# Altium integrated library Integrated_Library - 02.02.25 - 22.49.IntLib: 792 symbols (part 2 of 11)
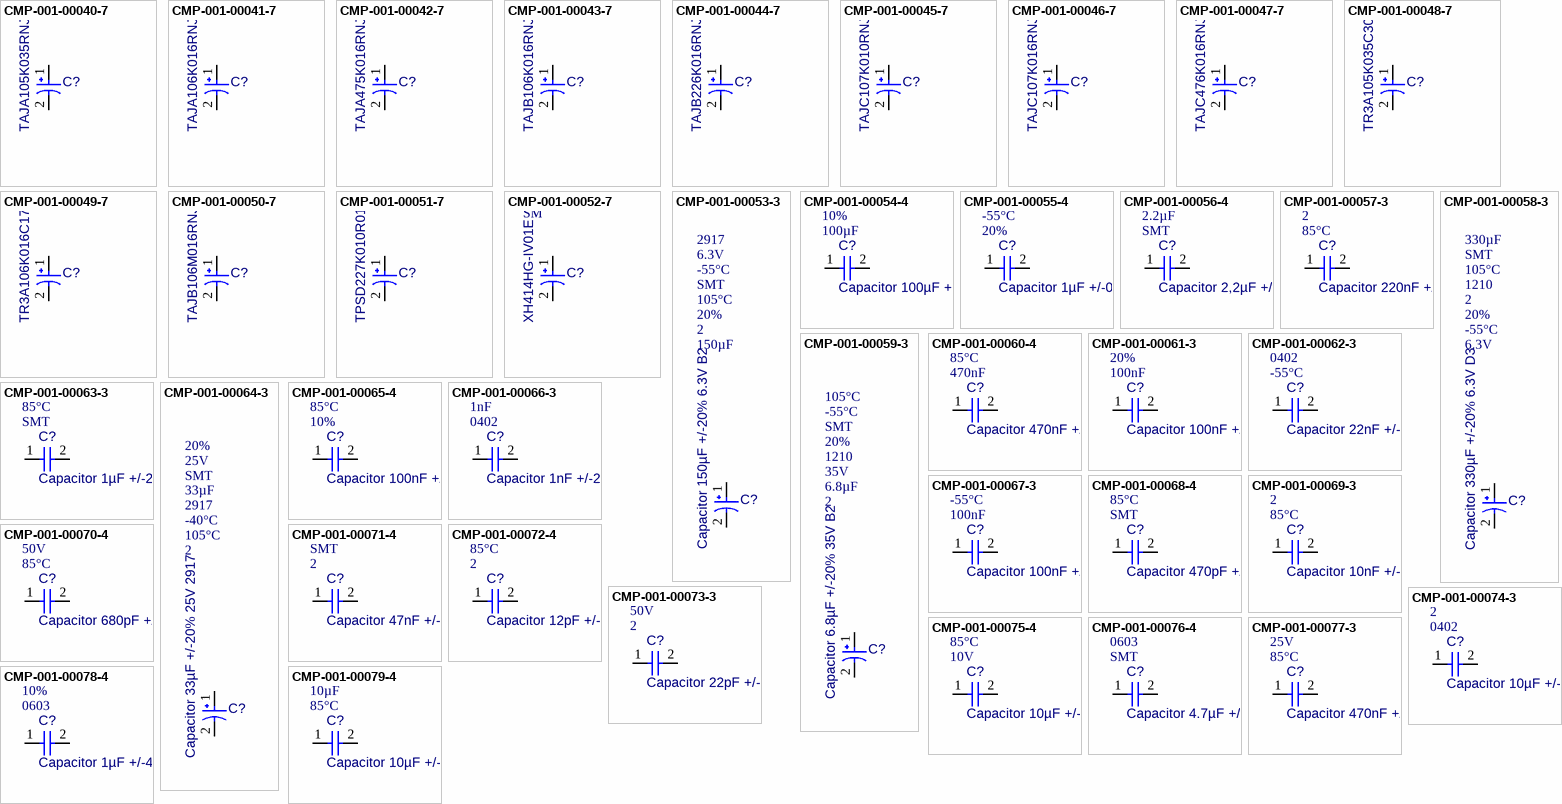
[diagram p27: symbols CMP-001-00040-7 to CMP-001-00079-4]

## CMP-001-00070-4
designator C?, comment Capacitor 680pF +/-20% 50V 0402  value 680pF  Max Operating Temperature: 85°C  Voltage Rating: 50V  Tolerance: 10%  Mounting Technology: SMT  Pins: 2  Case/Package: 0402  Min Operating Temperature: -55°C
Chip Capacitor, 680pF +/-20%, 50V, 0402, Thickness 0.33 mm
footprint CAPC0603(1608)100_L (Chip Capacitor, Body 1.6x0.8mm, Height 1.0mm, IPC High Density)
footprint CAPC0402(1005)33_L (Chip Capacitor, Body 1.0x0.5mm, Height 0.33mm, IPC High Density)
pins: 1, 2

## CMP-001-00071-4
designator C?, comment Capacitor 47nF +/-20% 50V 0402  value 47nF  Pins: 2  Mounting Technology: SMT  Voltage Rating: 50V  Case/Package: 0402  Max Operating Temperature: 85°C  Tolerance: 20%  Min Operating Temperature: -55°C
Chip Capacitor, 47nF +/-20%, 50V, 0402, Thickness 0.6 mm
footprint CAPC0603(1608)100_L (Chip Capacitor, Body 1.6x0.8mm, Height 1.0mm, IPC High Density)
footprint CAPC0402(1005)60_L (Chip Capacitor, Body 1.0x0.5mm, Height 0.6mm, IPC High Density)
pins: 1, 2

## CMP-001-00072-4
designator C?, comment Capacitor 12pF +/-10% 50V 0402  value 12pF  Pins: 2  Max Operating Temperature: 85°C  Case/Package: 0402  Voltage Rating: 50V  Tolerance: 20%  Mounting Technology: SMT  Min Operating Temperature: -55°C
Chip Capacitor, 12pF +/-10%, 50V, 0402, Thickness 0.33 mm
footprint CAPC0603(1608)100_L (Chip Capacitor, Body 1.6x0.8mm, Height 1.0mm, IPC High Density)
footprint CAPC0402(1005)33_L (Chip Capacitor, Body 1.0x0.5mm, Height 0.33mm, IPC High Density)
pins: 1, 2

## CMP-001-00073-3
designator C?, comment Capacitor 22pF +/-10% 50V 0402  value 22pF  Pins: 2  Voltage Rating: 50V  Max Operating Temperature: 85°C  Tolerance: 10%  Min Operating Temperature: -55°C  Mounting Technology: SMT  Case/Package: 0402
Chip Capacitor, 22pF +/-10%, 50V, 0402, Thickness 0.6 mm
footprint CAPC0603(1608)100_L (Chip Capacitor, Body 1.6x0.8mm, Height 1.0mm, IPC High Density)
footprint CAPC0402(1005)60_L (Chip Capacitor, Body 1.0x0.5mm, Height 0.6mm, IPC High Density)
pins: 1, 2

## CMP-001-00074-3
designator C?, comment Capacitor 10µF +/-40% 6.3V 0402  value 10µF  Case/Package: 0402  Pins: 2  Mounting Technology: SMT  Voltage Rating: 6.3V  Max Operating Temperature: 85°C  Min Operating Temperature: -55°C  Tolerance: 10%
Chip Capacitor, 10µF +/-40%, 6.3V, 0402, Thickness 0.6 mm
footprint CAPC0603(1608)100_L (Chip Capacitor, Body 1.6x0.8mm, Height 1.0mm, IPC High Density)
footprint CAPC0402(1005)60_L (Chip Capacitor, Body 1.0x0.5mm, Height 0.6mm, IPC High Density)
pins: 1, 2

## CMP-001-00075-4
designator C?, comment Capacitor 10µF +/-20% 10V 0603  value 10µF  Voltage Rating: 10V  Max Operating Temperature: 85°C  Pins: 2  Case/Package: 0603  Mounting Technology: SMT  Min Operating Temperature: -55°C  Tolerance: 10%
Chip Capacitor, 10µF +/-20%, 10V, 0603, Thickness 1 mm
footprint CAPC0603(1608)100_L (Chip Capacitor, Body 1.6x0.8mm, Height 1.0mm, IPC High Density)
footprint CAPC0603(1608)100_L (Chip Capacitor, Body 1.6x0.8mm, Height 1.0mm, IPC High Density)
pins: 1, 2

## CMP-001-00076-4
designator C?, comment Capacitor 4.7µF +/-20% 10V 0603  value 4.7µF  Mounting Technology: SMT  Case/Package: 0603  Pins: 2  Min Operating Temperature: -55°C  Tolerance: 10%  Max Operating Temperature: 85°C  Voltage Rating: 10V
Chip Capacitor, 4.7µF +/-20%, 10V, 0603, Thickness 1 mm
footprint CAPC0603(1608)100_L (Chip Capacitor, Body 1.6x0.8mm, Height 1.0mm, IPC High Density)
footprint CAPC0603(1608)100_L (Chip Capacitor, Body 1.6x0.8mm, Height 1.0mm, IPC High Density)
pins: 1, 2

## CMP-001-00077-3
designator C?, comment Capacitor 470nF +/-20% 25V 0603  value 470nF  Max Operating Temperature: 85°C  Voltage Rating: 25V  Pins: 2  Tolerance: 10%  Case/Package: 0603  Mounting Technology: SMT  Min Operating Temperature: -55°C
Chip Capacitor, 470nF +/-20%, 25V, 0603, Thickness 1 mm
footprint CAPC0603(1608)100_L (Chip Capacitor, Body 1.6x0.8mm, Height 1.0mm, IPC High Density)
footprint CAPC0603(1608)100_L (Chip Capacitor, Body 1.6x0.8mm, Height 1.0mm, IPC High Density)
pins: 1, 2

## CMP-001-00078-4
designator C?, comment Capacitor 1µF +/-40% 50V 0603  value 1µF  Case/Package: 0603  Tolerance: 10%  Pins: 2  Max Operating Temperature: 85°C  Voltage Rating: 50V  Mounting Technology: SMT  Min Operating Temperature: -55°C
Chip Capacitor, 1µF +/-40%, 50V, 0603, Thickness 1 mm
footprint CAPC0603(1608)100_L (Chip Capacitor, Body 1.6x0.8mm, Height 1.0mm, IPC High Density)
footprint CAPC0603(1608)100_L (Chip Capacitor, Body 1.6x0.8mm, Height 1.0mm, IPC High Density)
pins: 1, 2

## CMP-001-00079-4
designator C?, comment Capacitor 10µF +/-20% 25V 0805  value 10µF  Max Operating Temperature: 85°C  Case/Package: 0805  Voltage Rating: 25V  Tolerance: 10%  Min Operating Temperature: -55°C  Mounting Technology: SMT  Pins: 2
Chip Capacitor, 10µF +/-20%, 25V, 0805, Thickness 1.45 mm
footprint CAPC0603(1608)100_L (Chip Capacitor, Body 1.6x0.8mm, Height 1.0mm, IPC High Density)
footprint CAPC0805(2012)145_L (Chip Capacitor, Body 2.0x1.2mm, Height 1.45mm, IPC High Density)
pins: 1, 2

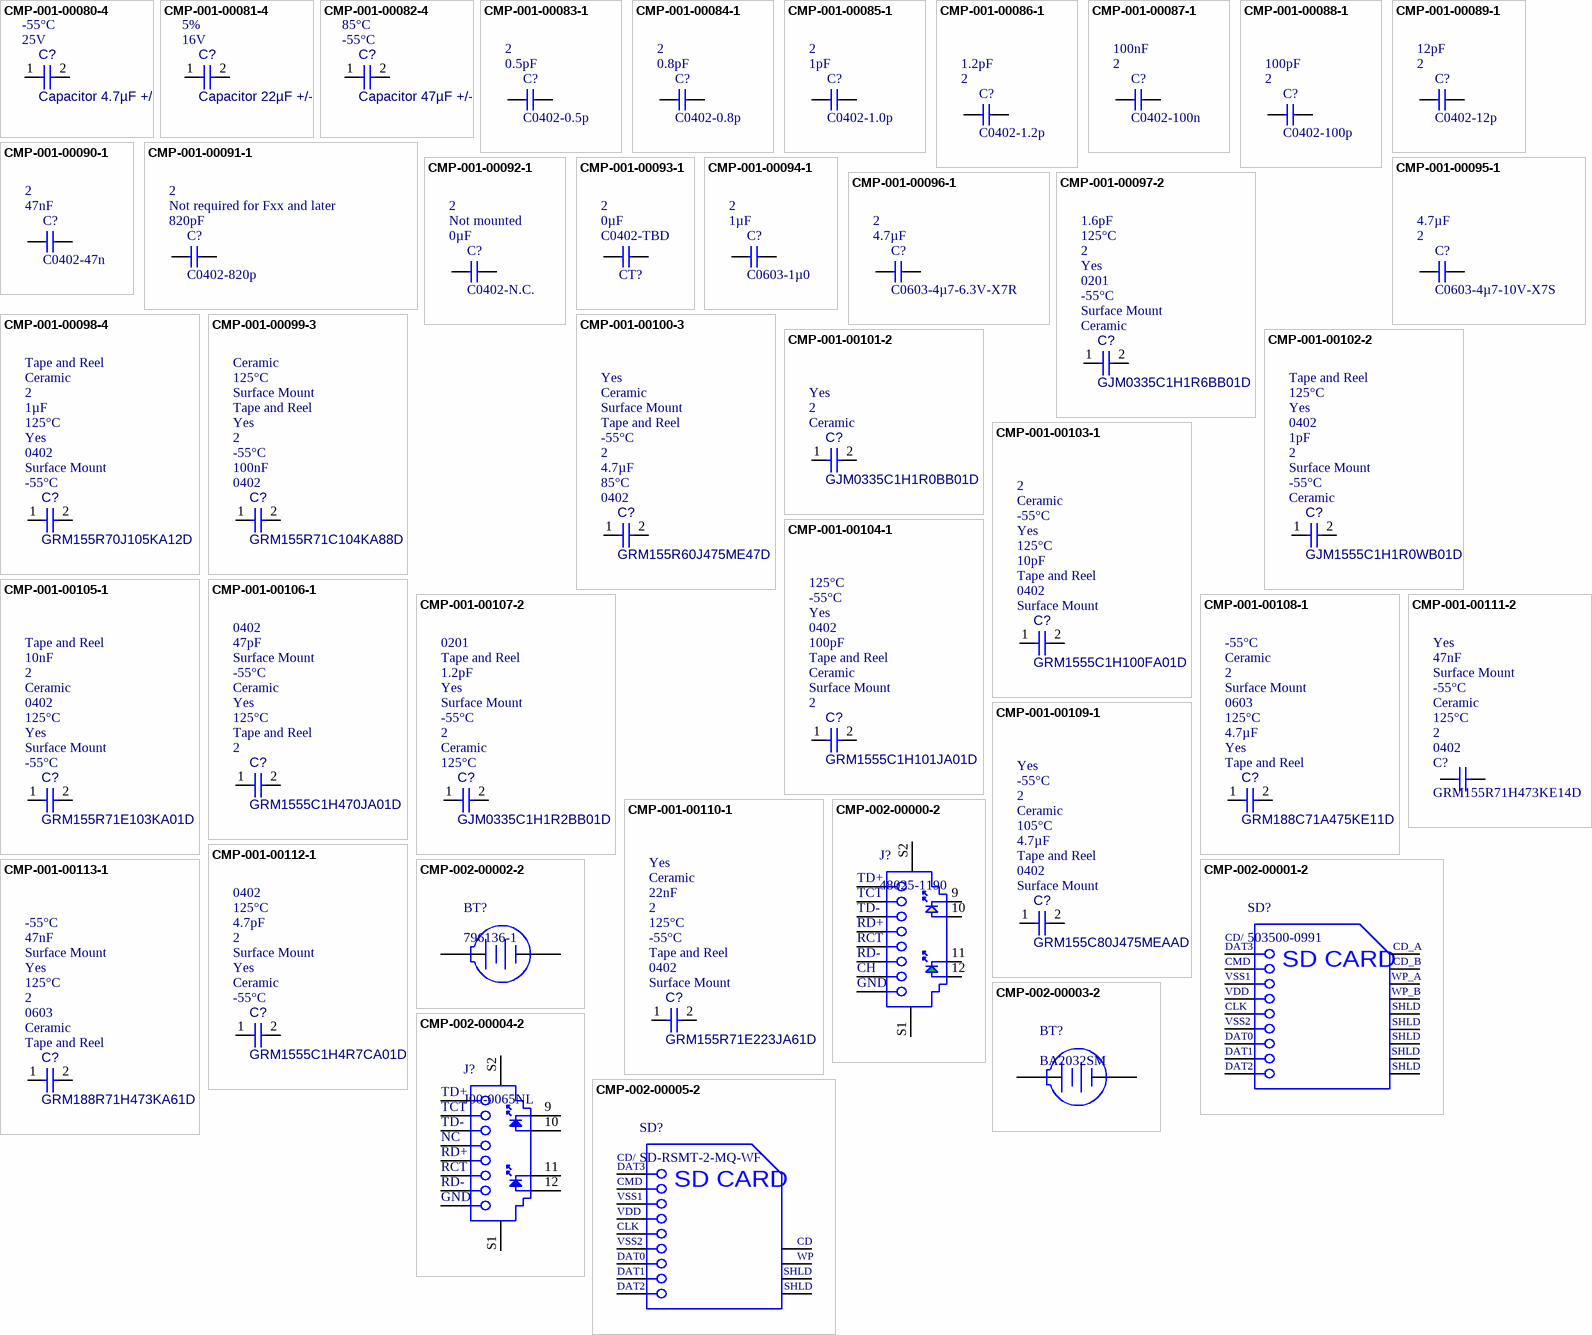
[diagram p2: symbols CMP-001-00080-4 to CMP-002-00005-2]

## CMP-001-00080-4
designator C?, comment Capacitor 4.7µF +/-40% 25V 0805  value 4.7µF  Voltage Rating: 25V  Min Operating Temperature: -55°C  Max Operating Temperature: 85°C  Pins: 2  Mounting Technology: SMT  Tolerance: 20%  Case/Package: 0805
Chip Capacitor, 4.7µF +/-40%, 25V, 0805, Thickness 1.45 mm
footprint CAPC0603(1608)100_L (Chip Capacitor, Body 1.6x0.8mm, Height 1.0mm, IPC High Density)
footprint CAPC0805(2012)145_L (Chip Capacitor, Body 2.0x1.2mm, Height 1.45mm, IPC High Density)
pins: 1, 2

## CMP-001-00081-4
designator C?, comment Capacitor 22µF +/-40% 16V 0805  value 22µF  Voltage Rating: 16V  Tolerance: 5%  Mounting Technology: SMT  Pins: 2  Max Operating Temperature: 85°C  Case/Package: 0805  Min Operating Temperature: -55°C
Chip Capacitor, 22µF +/-40%, 16V, 0805, Thickness 1.45 mm
footprint CAPC0603(1608)100_L (Chip Capacitor, Body 1.6x0.8mm, Height 1.0mm, IPC High Density)
footprint CAPC0805(2012)145_L (Chip Capacitor, Body 2.0x1.2mm, Height 1.45mm, IPC High Density)
pins: 1, 2

## CMP-001-00082-4
designator C?, comment Capacitor 47µF +/-40% 6.3V 0805  value 47µF  Min Operating Temperature: -55°C  Max Operating Temperature: 85°C  Case/Package: 0805  Pins: 2  Tolerance: 10%  Mounting Technology: SMT  Voltage Rating: 6.3V
Chip Capacitor, 47µF +/-40%, 6.3V, 0805, Thickness 1.45 mm
footprint CAPC0603(1608)100_L (Chip Capacitor, Body 1.6x0.8mm, Height 1.0mm, IPC High Density)
footprint CAPC0805(2012)145_L (Chip Capacitor, Body 2.0x1.2mm, Height 1.45mm, IPC High Density)
pins: 1, 2

## CMP-001-00083-1
designator C?, comment C0402-0.5p  value 0.5pF  Pins: 2
Capacitor, NP0, ±10%; Part Number: C0402-0.5p; LatestRevisionDate: 2017-02-23; Pad Count: 2; Footprint Doc: 0402; Design Item ID: C0402-0.5p; Source: nrf52840_qiaa.SCHLIB; Published: 2009-05-08; Component Type: Standard
footprint CAPC1608X06L
footprint CAPC1005X04L
pins: 1, 2

## CMP-001-00084-1
designator C?, comment C0402-0.8p  value 0.8pF  Pins: 2
Capacitor, NP0, ±10%; Design Item ID: C0402-0.8p; LatestRevisionDate: 2012-11-21; Footprint Doc: 0402; Component Type: Standard; Source: nrf52840_qiaa.SCHLIB; Part Number: C0402-0.8p; Pad Count: 2; Published: 2009-05-08
footprint CAPC1608X06L
footprint CAPC1005X04L
pins: 1, 2

## CMP-001-00085-1
designator C?, comment C0402-1.0p  value 1pF  Pins: 2
Capacitor, NP0, ±5%; Source: nrf52840_qiaa.SCHLIB; Component Type: Standard; Design Item ID: C0402-1.0p; Published: 2009-05-08; LatestRevisionDate: 2017-02-23; Pad Count: 2; Footprint Doc: 0402; Part Number: C0402-1.0p
footprint CAPC1608X06L
footprint CAPC1005X04L
pins: 1, 2

## CMP-001-00086-1
designator C?, comment C0402-1.2p  value 1.2pF  Pins: 2
Capacitor, NP0, ±5%; Design Item ID: C0402-1.2p; Footprint Doc: 0402; Source: nrf52840_qiaa.SCHLIB; Component Type: Standard; LatestRevisionDate: 2011-05-11; Published: 2009-05-08; Pad Count: 2; Part Number: C0402-1.2p
footprint CAPC1608X06L
footprint CAPC1005X04L
pins: 1, 2

## CMP-001-00087-1
designator C?, comment C0402-100n  value 100nF  Pins: 2
Capacitor, X7R, ±10%; Source: nrf52840_qiaa.SCHLIB; Published: 2009-05-08; Component Type: Standard; Pad Count: 2; Footprint Doc: 0402; Design Item ID: C0402-100n; Part Number: C0402-100n; LatestRevisionDate: 2009-11-23
footprint CAPC1608X06L
footprint CAPC1005X04L
pins: 1, 2

## CMP-001-00088-1
designator C?, comment C0402-100p  value 100pF  Pins: 2
Capacitor, NP0, ±5%; LatestRevisionDate: 2009-05-08; Part Number: C0402-100p; Published: 2009-05-08; Design Item ID: C0402-100p; Pad Count: 2; Footprint Doc: 0402; Source: nrf52840_qiaa.SCHLIB; Component Type: Standard
footprint CAPC1608X06L
footprint CAPC1005X04L
pins: 1, 2

## CMP-001-00089-1
designator C?, comment C0402-12p  value 12pF  Pins: 2
Capacitor, NP0, ±2%; Footprint Doc: 0402; Part Number: C0402-12p; Component Type: Standard; Pad Count: 2; Source: nrf52840_qiaa.SCHLIB; Design Item ID: C0402-12p; LatestRevisionDate: 2011-05-11; Published: 2009-05-08
footprint CAPC1608X06L
footprint CAPC1005X04L
pins: 1, 2

## CMP-001-00090-1
designator C?, comment C0402-47n  value 47nF  Pins: 2
Capacitor, X7R, ±10%; Component Type: Standard; Part Number: C0402-47n; Source: nrf52840_qiaa.SCHLIB; LatestRevisionDate: 2009-05-08; Published: 2009-05-08; Pad Count: 2; Footprint Doc: 0402; Design Item ID: C0402-47n
footprint CAPC1608X06L
footprint CAPC1005X04L
pins: 1, 2

## CMP-001-00091-1
designator C?, comment C0402-820p  value 820pF  Assembly: Not required for Fxx and later  Pins: 2
Capacitor, NP0, ±5%; Source: nrf52840_qiaa.SCHLIB; Part Number: C0402-820p; Published: 2009-05-08; Pad Count: 2; Component Type: Standard; LatestRevisionDate: 2009-05-08; Footprint Doc: 0402; Design Item ID: C0402-820p
footprint CAPC1608X06L
footprint CAPC1005X04L
pins: 1, 2

## CMP-001-00092-1
designator C?, comment C0402-N.C.  value 0µF  Assembly: Not mounted  Pins: 2
Not mounted; Component Type: Standard; Published: 2009-05-08; Source: nrf52840_qiaa.SCHLIB; Footprint Doc: 0402; Pad Count: 2; Design Item ID: C0402-N.C.; LatestRevisionDate: 2009-05-08; Part Number: C0402-N.C.
footprint CAPC1608X06L
footprint CAPC1005X04L
pins: 1, 2

## CMP-001-00093-1
designator CT?, comment C0402-TBD  value 0µF  Pins: 2
Capacitor, NP0, ±5%; Source: nrf52840_qiaa.SCHLIB; LatestRevisionDate: 2010-12-21; Pad Count: 2; Published: 2010-12-21; Footprint Doc: 0402; Design Item ID: C0402-TBD; Part Number: C0402-TBD; Component Type: Standard
footprint CAPC1005X04L
footprint CAPC1005X04L
pins: 1, 2

## CMP-001-00094-1
designator C?, comment C0603-1µ0  value 1µF  Pins: 2
Capacitor, X7R, ±10%; Pad Count: 2; Published: 2009-05-08; Source: nrf52840_qiaa.SCHLIB; Design Item ID: C0603-1µ0; LatestRevisionDate: 2013-06-05; Footprint Doc: 0603; Part Number: C0603-1µ0; Component Type: Standard
footprint CAPC1608X06L
footprint CAPC1608X06L
pins: 1, 2

## CMP-001-00095-1
designator C?, comment C0603-4µ7-10V-X7S  value 4.7µF  Pins: 2
Capacitor, X7S, ±10%; Component Type: Standard; Source: nrf52840_qiaa.SCHLIB; Pad Count: 2; LatestRevisionDate: 2016-08-15; Footprint Doc: 0603; Design Item ID: C0603-4µ7-10V-X7S; Published: 2016-08-15; Part Number: C0603-4µ7-10V-X7S
footprint CAPC1608X06L
footprint CAPC1608X06L
pins: 1, 2

## CMP-001-00096-1
designator C?, comment C0603-4µ7-6.3V-X7R  value 4.7µF  Pins: 2
Capacitor, X7R, ±10%; Footprint Doc: 0603; Source: nrf52840_qiaa.SCHLIB; Part Number: C0603-4µ7-6.3V-X7R; Published: 2015-06-10; LatestRevisionDate: 2015-06-10; Design Item ID: C0603-4µ7-6.3V-X7R; Component Type: Standard; Pad Count: 2
footprint CAPC1608X06L
footprint CAPC1608X06L
pins: 1, 2

## CMP-001-00097-2
designator C?, comment GJM0335C1H1R6BB01D  value 1.6pF  Capacitor Type: Ceramic  Mounting Technology: Surface Mount  Min Operating Temperature: -55°C  Case/Package: 0201  RoHS Compliant: Yes  Pins: 2  Max Operating Temperature: 125°C
Ceramic Capacitor, Multilayer, Ceramic, 50V, 6.25% +Tol, 6.25% -Tol, C0G, 30ppm/Cel TC, 0.0000016uF, Surface Mount, 0201; Dielectric Material: Ceramic
footprint CAPC0603(1608)100_L (Chip Capacitor, Body 1.6x0.8mm, Height 1.0mm, IPC High Density)
footprint FP-GJM033-0_03-IPC_A
footprint FP-GJM033-0_03-IPC_C
footprint FP-GJM033-0_03-ANT
footprint FP-GJM033-0_03-IPC_B
pins: 1, 2

## CMP-001-00098-4
designator C?, comment GRM155R70J105KA12D  value 1µF  Min Operating Temperature: -55°C  Mounting Technology: Surface Mount  Case/Package: 0402  RoHS Compliant: Yes  Max Operating Temperature: 125°C  Pins: 2  Capacitor Type: Ceramic  Packaging: Tape and Reel
Ceramic Capacitor, Multilayer, Ceramic, 6.3V, 10% +Tol, 10% -Tol, X7R, 15% TC, 1uF, Surface Mount, 0402; Rated DC Voltage (URdc): 6.3V; Terminal Finish: Nickel; Length: 1mm; Reach SVHC Compliant: Yes; Tolerance (fill in as +-): 10%; Temperature Characteristics Code: X7R; JESD-609 Code: e3; Height: 0.5mm; Package Shape: Rectangular; Dielectric Material: Ceramic; Package Style: SMTMeter; Termination: Wraparound; Tolerance  (fill in as +-): 10%; Multilayer: Yes; Width: 0.5mm
footprint CAPC0603(1608)100_L (Chip Capacitor, Body 1.6x0.8mm, Height 1.0mm, IPC High Density)
footprint FP-GRM155-0_05-IPC_A
footprint FP-GRM155-0_05-IPC_C
footprint FP-GRM155-0_05-MFG
footprint CAPC0402(1005)33_L (Chip Capacitor, Body 1.0x0.5mm, Height 0.33mm, IPC High Density)
footprint FP-GRM155-0_05-IPC_B
pins: 1, 2

## CMP-001-00099-3
designator C?, comment GRM155R71C104KA88D  value 100nF  Case/Package: 0402  Min Operating Temperature: -55°C  Pins: 2  RoHS Compliant: Yes  Packaging: Tape and Reel  Mounting Technology: Surface Mount  Max Operating Temperature: 125°C  Capacitor Type: Ceramic
Ceramic Capacitor, Multilayer, Ceramic, 16V, 10% +Tol, 10% -Tol, X7R, 15% TC, 0.1uF, Surface Mount, 0402; Package Shape: Rectangular; Terminal Finish: Nickel; Dielectric Material: Ceramic; Temperature Characteristics Code: X7R; Rated DC Voltage (URdc): 16V; Package Style: SMTMeter; Multilayer: Yes; JESD-609 Code: e3; Reach SVHC Compliant: Yes; Tolerance  (fill in as +-): 10%; Termination: Wraparound; Length: 1mm; Width: 0.5mm; Height: 0.5mm; Tolerance (fill in as +-): 10%
footprint CAPC0603(1608)100_L (Chip Capacitor, Body 1.6x0.8mm, Height 1.0mm, IPC High Density)
footprint FP-GRM15-IPC_C
footprint FP-GRM15-MFG
footprint CAPC0402(1005)33_L (Chip Capacitor, Body 1.0x0.5mm, Height 0.33mm, IPC High Density)
footprint FP-GRM15-IPC_B
footprint FP-GRM15-IPC_A
pins: 1, 2

## CMP-001-00100-3
designator C?, comment GRM155R60J475ME47D  value 4.7µF  Case/Package: 0402  Max Operating Temperature: 85°C  Pins: 2  Min Operating Temperature: -55°C  Packaging: Tape and Reel  Mounting Technology: Surface Mount  Capacitor Type: Ceramic  RoHS Compliant: Yes
Ceramic Capacitor, Multilayer, Ceramic, 6.3V, 20% +Tol, 20% -Tol, X5R, 15% TC, 4.7uF, Surface Mount, 0402; Termination: Wraparound; Tolerance (fill in as +-): 20%; Height: 0.5mm; Package Shape: Rectangular; Multilayer: Yes; Reach SVHC Compliant: Yes; Tolerance  (fill in as +-): 20%; Dielectric Material: Ceramic; Rated DC Voltage (URdc): 6.3V; Width: 0.5mm; Package Style: SMTMeter; Length: 1mm; Temperature Characteristics Code: X5R; Terminal Finish: Nickel; JESD-609 Code: e3
footprint CAPC0603(1608)100_L (Chip Capacitor, Body 1.6x0.8mm, Height 1.0mm, IPC High Density)
footprint FP-GRM155-0_1-IPC_A
footprint FP-GRM155-0_1-IPC_B
footprint FP-GRM155-0_1-MFG
footprint CAPC0402(1005)33_L (Chip Capacitor, Body 1.0x0.5mm, Height 0.33mm, IPC High Density)
footprint FP-GRM155-0_1-IPC_C
pins: 1, 2

## CMP-001-00101-2
designator C?, comment GJM0335C1H1R0BB01D  Capacitor Type: Ceramic  Pins: 2  RoHS Compliant: Yes
Ceramic Capacitor, Multilayer, Ceramic, 50V, 10% +Tol, 10% -Tol, C0G, 30ppm/Cel TC, 0.000001uF, Surface Mount, 0201; Terminal Finish: Nickel; Reach SVHC Compliant: Yes; JESD-609 Code: e3; Dielectric Material: Ceramic
footprint CAPC0603(1608)100_L (Chip Capacitor, Body 1.6x0.8mm, Height 1.0mm, IPC High Density)
footprint FP-GJM033-0_03-IPC_C
footprint FP-GJM033-0_03-IPC_A
footprint FP-GJM033-0_03-IPC_B
footprint FP-GJM033-0_03-MFG
pins: 1, 2

## CMP-001-00102-2
designator C?, comment GJM1555C1H1R0WB01D  value 1pF  Capacitor Type: Ceramic  Min Operating Temperature: -55°C  Mounting Technology: Surface Mount  Pins: 2  Case/Package: 0402  RoHS Compliant: Yes  Max Operating Temperature: 125°C  Packaging: Tape and Reel
Ceramic Capacitor, Multilayer, Ceramic, 50V, 5% +Tol, 5% -Tol, C0G, 30ppm/Cel TC, 0.000001uF, Surface Mount, 0402; Reach SVHC Compliant: Yes; Width: 0.5mm; Tolerance (fill in as +-): 5%; Dielectric Material: Ceramic; Tolerance  (fill in as +-): 5%; Package Shape: Rectangular; Temperature Characteristics Code: C0G; Rated DC Voltage (URdc): 50V; Package Style: SMTMeter; JESD-609 Code: e3; Multilayer: Yes; Termination: Wraparound; Terminal Finish: Nickel; Length: 1mm; Height: 0.5mm
footprint CAPC0603(1608)100_L (Chip Capacitor, Body 1.6x0.8mm, Height 1.0mm, IPC High Density)
footprint FP-GJM155-0_05-IPC_A
footprint FP-GJM155-0_05-IPC_B
footprint FP-GJM155-0_05-MFG
footprint FP-GJM155-0_05-IPC_C
pins: 1, 2

## CMP-001-00103-1
designator C?, comment GRM1555C1H100FA01D  value 10pF  Mounting Technology: Surface Mount  Case/Package: 0402  Packaging: Tape and Reel  Max Operating Temperature: 125°C  RoHS Compliant: Yes  Min Operating Temperature: -55°C  Capacitor Type: Ceramic  Pins: 2
Ceramic Capacitor, Multilayer, Ceramic, 50V, 1% +Tol, 1% -Tol, C0G, 30ppm/Cel TC, 0.00001uF, Surface Mount, 0402; Termination: Wraparound; Rated DC Voltage (URdc): 50V; Terminal Finish: Nickel; Dielectric Material: Ceramic; Temperature Characteristics Code: C0G; Tolerance  (fill in as +-): 1%; Multilayer: Yes; JESD-609 Code: e3; Reach SVHC Compliant: Yes; Tolerance (fill in as +-): 1%; Package Shape: Rectangular
footprint CAPC0603(1608)100_L (Chip Capacitor, Body 1.6x0.8mm, Height 1.0mm, IPC High Density)
footprint FP-GRM155-0_05-IPC_A-3
footprint FP-GRM155-0_05-IPC_C-2
footprint FP-GRM155-0_05-IPC_B-4
pins: 1, 2

## CMP-001-00104-1
designator C?, comment GRM1555C1H101JA01D  value 100pF  Pins: 2  Mounting Technology: Surface Mount  Capacitor Type: Ceramic  Packaging: Tape and Reel  Case/Package: 0402  RoHS Compliant: Yes  Min Operating Temperature: -55°C  Max Operating Temperature: 125°C
Ceramic Capacitor, Multilayer, Ceramic, 50V, 5% +Tol, 5% -Tol, C0G, 30ppm/Cel TC, 0.0001uF, Surface Mount, 0402; Height: 0.5mm; Tolerance (fill in as +-): 5%; Length: 1mm; Width: 0.5mm; Multilayer: Yes; Termination: Wraparound; Package Shape: Rectangular; JESD-609 Code: e3; Temperature Characteristics Code: C0G; Rated DC Voltage (URdc): 50V; Terminal Finish: Nickel; Tolerance  (fill in as +-): 5%; Package Style: SMTMeter; Dielectric Material: Ceramic; Reach SVHC Compliant: Yes
footprint CAPC0603(1608)100_L (Chip Capacitor, Body 1.6x0.8mm, Height 1.0mm, IPC High Density)
footprint CAPC1005X55X25NL05T10 (Chip Capacitor, 2-Leads, Body 1.00x0.50mm, IPC Medium Density)
footprint CAPC1005X55X25ML05T10 (Chip Capacitor, 2-Leads, Body 1.00x0.50mm, IPC Low Density)
footprint CAPC1005X55X25LL05T10 (Chip Capacitor, 2-Leads, Body 1.00x0.50mm, IPC High Density)
pins: 1, 2

## CMP-001-00105-1
designator C?, comment GRM155R71E103KA01D  value 10nF  Min Operating Temperature: -55°C  Mounting Technology: Surface Mount  RoHS Compliant: Yes  Max Operating Temperature: 125°C  Case/Package: 0402  Capacitor Type: Ceramic  Pins: 2  Packaging: Tape and Reel
Ceramic Capacitor, Multilayer, Ceramic, 25V, 10% +Tol, 10% -Tol, X7R, 15% TC, 0.01uF, Surface Mount, 0402; Width: 0.5mm; Package Shape: Rectangular; Dielectric Material: Ceramic; Temperature Characteristics Code: X7R; Rated DC Voltage (URdc): 25V; Tolerance (fill in as +-): 10%; Termination: Wraparound; Terminal Finish: Nickel; Reach SVHC Compliant: Yes; Height: 0.5mm; Package Style: SMTMeter; Tolerance  (fill in as +-): 10%; Multilayer: Yes; Length: 1mm; JESD-609 Code: e3
footprint CAPC0603(1608)100_L (Chip Capacitor, Body 1.6x0.8mm, Height 1.0mm, IPC High Density)
footprint CAPC1005X55X25NL05T10-23 (Chip Capacitor, 2-Leads, Body 1.00x0.50mm, IPC Medium Density)
footprint CAPC1005X55X25ML05T10-24 (Chip Capacitor, 2-Leads, Body 1.00x0.50mm, IPC Low Density)
footprint CAPC1005X55X25LL05T10-25 (Chip Capacitor, 2-Leads, Body 1.00x0.50mm, IPC High Density)
pins: 1, 2

## CMP-001-00106-1
designator C?, comment GRM1555C1H470JA01D  value 47pF  Pins: 2  Packaging: Tape and Reel  Max Operating Temperature: 125°C  RoHS Compliant: Yes  Capacitor Type: Ceramic  Min Operating Temperature: -55°C  Mounting Technology: Surface Mount  Case/Package: 0402
Ceramic Capacitor, Multilayer, Ceramic, 50V, 5% +Tol, 5% -Tol, C0G, 30ppm/Cel TC, 0.000047uF, Surface Mount, 0402; Temperature Characteristics Code: C0G; Termination: Wraparound; Dielectric Material: Ceramic; JESD-609 Code: e3; Width: 0.5mm; Height: 0.5mm; Package Shape: Rectangular; Tolerance (fill in as +-): 5%; Length: 1mm; Terminal Finish: Nickel; Package Style: SMTMeter; Rated DC Voltage (URdc): 50V; Tolerance  (fill in as +-): 5%; Multilayer: Yes; Reach SVHC Compliant: Yes
footprint CAPC0603(1608)100_L (Chip Capacitor, Body 1.6x0.8mm, Height 1.0mm, IPC High Density)
footprint CAPC1005X55X25NL05T10-29 (Chip Capacitor, 2-Leads, Body 1.00x0.50mm, IPC Medium Density)
footprint CAPC1005X55X25LL05T10-30 (Chip Capacitor, 2-Leads, Body 1.00x0.50mm, IPC High Density)
footprint CAPC1005X55X25ML05T10-31 (Chip Capacitor, 2-Leads, Body 1.00x0.50mm, IPC Low Density)
pins: 1, 2

## CMP-001-00107-2
designator C?, comment GJM0335C1H1R2BB01D  value 1.2pF  Max Operating Temperature: 125°C  Capacitor Type: Ceramic  Pins: 2  Min Operating Temperature: -55°C  Mounting Technology: Surface Mount  RoHS Compliant: Yes  Packaging: Tape and Reel  Case/Package: 0201
Ceramic Capacitor, Multilayer, Ceramic, 50V, 8.33% +Tol, 8.33% -Tol, C0G, 30ppm/Cel TC, 0.0000012uF, Surface Mount, 0201; Package Shape: Rectangular; Terminal Finish: Nickel; Termination: Wraparound; Temperature Characteristics Code: C0G; Dielectric Material: Ceramic; Rated DC Voltage (URdc): 50V; Reach SVHC Compliant: Yes; Tolerance (fill in as +-): 8.33%; JESD-609 Code: e3; Multilayer: Yes; Tolerance  (fill in as +-): 8.33%
footprint CAPC0603(1608)100_L (Chip Capacitor, Body 1.6x0.8mm, Height 1.0mm, IPC High Density)
footprint FP-GJM033-0_03-IPC_B
footprint FP-GJM033-0_03-IPC_A
footprint FP-GJM033-0_03-MFG
footprint FP-GJM033-0_03-IPC_C
pins: 1, 2

## CMP-001-00108-1
designator C?, comment GRM188C71A475KE11D  value 4.7µF  Packaging: Tape and Reel  RoHS Compliant: Yes  Max Operating Temperature: 125°C  Case/Package: 0603  Mounting Technology: Surface Mount  Pins: 2  Capacitor Type: Ceramic  Min Operating Temperature: -55°C
Ceramic Capacitor, Multilayer, Ceramic, 10V, 10% +Tol, 10% -Tol, X7S, 22% TC, 4.7uF, Surface Mount, 0603; Dielectric Material: Ceramic; Package Shape: Rectangular; Reach SVHC Compliant: Yes; Termination: Wraparound; Temperature Characteristics Code: X7S; Length: 1.6mm; Multilayer: Yes; JESD-609 Code: e3; Height: 0.8mm; Width: 0.8mm; Tolerance  (fill in as +-): 10%; Terminal Finish: Nickel; Rated DC Voltage (URdc): 10V; Package Style: SMTMeter; Tolerance (fill in as +-): 10%
footprint CAPC0603(1608)100_L (Chip Capacitor, Body 1.6x0.8mm, Height 1.0mm, IPC High Density)
footprint FP-GRM188-0_15-IPC_C
pins: 1, 2

## CMP-001-00109-1
designator C?, comment GRM155C80J475MEAAD  value 4.7µF  Mounting Technology: Surface Mount  Case/Package: 0402  Packaging: Tape and Reel  Max Operating Temperature: 105°C  Capacitor Type: Ceramic  Pins: 2  Min Operating Temperature: -55°C  RoHS Compliant: Yes
Ceramic Capacitor, Multilayer, Ceramic, 6.3V, 20% +Tol, 20% -Tol, X6S, 22% TC, 4.7uF, Surface Mount, 0402; Tolerance  (fill in as +-): 20%; Reach SVHC Compliant: Yes; Temperature Characteristics Code: X6S; JESD-609 Code: e3; Terminal Finish: Nickel; Package Style: SMTMeter; Rated DC Voltage (URdc): 6.3V; Termination: Wraparound; Package Shape: Rectangular; Width: 0.5mm; Height: 0.5mm; Dielectric Material: Ceramic; Multilayer: Yes; Tolerance (fill in as +-): 20%; Length: 1mm
footprint CAPC0603(1608)100_L (Chip Capacitor, Body 1.6x0.8mm, Height 1.0mm, IPC High Density)
footprint FP-GRM155-0_15-IPC_A
footprint FP-GRM155-0_15-IPC_C
footprint FP-GRM155-0_15-IPC_B
footprint FP-GRM155-0_15-MFG
pins: 1, 2

## CMP-001-00110-1
designator C?, comment GRM155R71E223JA61D  value 22nF  Mounting Technology: Surface Mount  Case/Package: 0402  Packaging: Tape and Reel  Min Operating Temperature: -55°C  Max Operating Temperature: 125°C  Pins: 2  Capacitor Type: Ceramic  RoHS Compliant: Yes
Ceramic Capacitor, Multilayer, Ceramic, 25V, 5% +Tol, 5% -Tol, X7R, 15% TC, 0.022uF, Surface Mount, 0402; Package Shape: Rectangular; Tolerance (fill in as +-): 5%; Termination: Wraparound; Dielectric Material: Ceramic; JESD-609 Code: e3; Reach SVHC Compliant: Yes; Tolerance  (fill in as +-): 5%; Temperature Characteristics Code: X7R; Terminal Finish: Nickel; Rated DC Voltage (URdc): 25V; Multilayer: Yes
footprint CAPC0603(1608)100_L (Chip Capacitor, Body 1.6x0.8mm, Height 1.0mm, IPC High Density)
footprint FP-GRM155-0_05-IPC_B-4
footprint FP-GRM155-0_05-IPC_C-2
footprint FP-GRM155-0_05-MFG-5
footprint FP-GRM155-0_05-IPC_A-3
pins: 1, 2

## CMP-001-00111-2
designator C?, comment GRM155R71H473KE14D  value 47nF  Case/Package: 0402  Pins: 2  Max Operating Temperature: 125°C  Capacitor Type: Ceramic  Min Operating Temperature: -55°C  Mounting Technology: Surface Mount  RoHS Compliant: Yes
Ceramic Capacitor, Multilayer, Ceramic, 50V, 10% +Tol, 10% -Tol, X7R, 15% TC, 0.047uF, Surface Mount, 0402; Height: 0.5mm; Dielectric Material: Ceramic
footprint FP-GRM155-0_05-IPC_B-4
footprint FP-GRM155-0_05-MFG-5
footprint FP-GRM155-0_05-IPC_C-2
footprint FP-GRM155-0_05-IPC_A-3
pins: 1, 2

## CMP-001-00112-1
designator C?, comment GRM1555C1H4R7CA01D  value 4.7pF  Min Operating Temperature: -55°C  Capacitor Type: Ceramic  RoHS Compliant: Yes  Mounting Technology: Surface Mount  Pins: 2  Max Operating Temperature: 125°C  Case/Package: 0402
Ceramic Capacitor, Multilayer, Ceramic, 50V, 5.32% +Tol, 5.32% -Tol, C0G, 30ppm/Cel TC, 0.0000047uF, Surface Mount, 0402; Dielectric Material: Ceramic; Height: 0.5mm
footprint CAPC0603(1608)100_L (Chip Capacitor, Body 1.6x0.8mm, Height 1.0mm, IPC High Density)
footprint FP-GRM155-0_05-IPC_C-2
footprint FP-GRM155-0_05-IPC_A-3
footprint FP-GRM155-0_05-IPC_B-4
footprint FP-GRM155-0_05-MFG-5
pins: 1, 2

## CMP-001-00113-1
designator C?, comment GRM188R71H473KA61D  value 47nF  Packaging: Tape and Reel  Capacitor Type: Ceramic  Case/Package: 0603  Pins: 2  Max Operating Temperature: 125°C  RoHS Compliant: Yes  Mounting Technology: Surface Mount  Min Operating Temperature: -55°C
Ceramic Capacitor, Multilayer, Ceramic, 50V, 10% +Tol, 10% -Tol, X7R, 15% TC, 0.047uF, Surface Mount, 0603; Rated DC Voltage (URdc): 50V; Width: 0.8mm; Package Style: SMTMeter; Multilayer: Yes; JESD-609 Code: e3; Termination: Wraparound; Height: 0.8mm; Length: 1.6mm; Tolerance (fill in as +-): 10%; Package Shape: Rectangular; Tolerance  (fill in as +-): 10%; Temperature Characteristics Code: X7R; Dielectric Material: Ceramic; Terminal Finish: Nickel; Reach SVHC Compliant: Yes
footprint CAPC0603(1608)100_L (Chip Capacitor, Body 1.6x0.8mm, Height 1.0mm, IPC High Density)
footprint CAPC1608X90X35NL10T15 (Chip Capacitor, 2-Leads, Body 1.60x0.80mm, IPC Medium Density)
footprint CAPC1608X90X35ML10T15 (Chip Capacitor, 2-Leads, Body 1.60x0.80mm, IPC Low Density)
footprint CAPC1608X90X35LL10T15 (Chip Capacitor, 2-Leads, Body 1.60x0.80mm, IPC High Density)
pins: 1, 2

## CMP-002-00000-2
designator J?, comment 48025-1190
Modular Jack with Integrated Magnetics with LED, 1.5 A, -40 to 70 degC, 12-Pin THD, RoHS, Tray; Manufacturer: Molex; Shielding: Shielded; Max Voltage Rating (AC): 150V; Capacitance: -45f; Gender: Female; Current Rating: 1.5A; Packaging: Tray; Package Quantity: 1080; RoHS Compliant: True; Contact Plating: Gold; Package Description: 12-Pin Through Hole Device, Body 16.2 x 25.4 mm; Min Operating Temperature: -40°C; Manufacturer URL: http://www.molex.com/; Package Reference: 48025-1190; Max Operating Temperature: 70°C; Pins: 8; Datasheet URL: http://www.molex.com/pdm_docs/sd/480251190_sd.pdf; Datasheet Version: Rev. G, 01/2012; Housing Material: Nylon; Case/Package: 48025-1190; Lead Pitch: 1.27mm; Voltage Rating: 150V; Connector Type: Modular; Contact Material: Brass; Mounting Technology: TH
footprint MOLX-48025-1190_V (Connector, 12-Leads, Body 16.2x25.4mm)
pins: 1 TD+, 2 TCT, 3 TD-, 4 RD+, 5 RCT, 6 RD-, 7 CHASSIS, 8 GND, 9, 10, 11, 12, S1, S2
text: CH

## CMP-002-00001-2
designator SD?, comment 503500-0991
SD and Combo Memory Card Connector, Pitch 2.5 mm, 1 x 6 Position, -25 to 85 degC, RoHS, Tape and Reel; Manufacturer: Molex; Current Rating: 500mA; Connector Type: SDCard; Voltage Rating (AC): 50V; Package Reference: 503500-0991; Pins: 9; Max Operating Temperature: 85°C; Manufacturer URL: http://www.molex.com/; Case/Package: 503500-0991; Mounting Technology: SM; Contact Plating: Gold; Datasheet URL: http://www.molex.com/pdm_docs/sd/5035000991_sd.pdf; Contact Finish: Gold; Contact Material: Copper; Lead Pitch: 2.5mm; Min Operating Temperature: -25°C; Datasheet Version: Rev. B, 02/2010; Package Quantity: 500; RoHS Compliant: True; Package Description: SD Card Connector, 9 Position Surface Mount, Length 28.6 mm, Height 3.1 mm; Packaging: TapeandReel
footprint MOLX-503500-0991_V (SD Card, 9-Leads, Body 28.6x27.8mm)
pins: 1 CD/DAT3, 2 CMD, 3 VSS1, 4 VDD, 5 CLK, 6 VSS2, 7 DAT0, 8 DAT1, 9 DAT2, 10 CD_A, 11 CD_B, 12 WP_A, 13 WP_B, 14 SHLD1, 15 SHLD2, 16 SHLD3, 17 SHLD4, 18 SHLD5
text: CD/; DAT3; SD CARD; SHLD

## CMP-002-00002-2
designator BT?, comment 796136-1
Battery Connector, 1 Cell, CR2032, 2-Pin SMD, RoHS, Tape and Reel; Manufacturer: TE Connectivity; Max Voltage Rating (AC): 30V; Connector Type: BatteryHolder; Batteries: 1; Datasheet URL: http://www.te.com/commerce/DocumentDelivery/DDEController?Action=srchrtrv&DocNm=796136&DocType=Customer+Drawing&DocLang=English&DocFormat=pdf&PartCntxt=796136-1; Contact Plating: Tin; Case/Package: 796136-1; Colour: Black; Package Reference: 796136-1; Package Quantity: 400; Pins: 2; Mounting Technology: SM; RoHS Compliant: True; Datasheet Version: Dec-13; Package Description: 2-Pin Surface Mount Device, Body 32.31 x 19.05 mm; Packaging: TapeandReel; Manufacturer URL: http://www.te.com/; Contact Material: Bronze
footprint TECO-796136-1_V (SMD, 2-Leads, Body 32.31x19.05mm)
pins: 1 +, 2 -

## CMP-002-00003-2
designator BT?, comment BA2032SM
Coin Cell Holder, 1 Cell, -40 to 225 degC, 2-Pin SMD, RoHS, Tray; Manufacturer: Memory Protection Devices; Connector Type: BatteryHolder; Package Quantity: 100; Package Description: 2-Pin Surface Mount Device, Body 28 x 16 mm; Datasheet Version: Rev. H, 03/2014; RoHS Compliant: True; Case/Package: BA2032SM; Mounting Technology: SM; Min Operating Temperature: -40°C; Package Reference: BA2032SM; Max Operating Temperature: 225°C; Datasheet URL: http://www.onlinecomponents.com/datasheet/ba2032sm.aspx?p=11910700
footprint MPD-BA2032SM_V (Coin Cell Holder, 2-Leads, Body 28x16mm)
pins: 1 +, 2 -

## CMP-002-00004-2
designator J?, comment J00-0065NL
1x1 Tab-Down RJ45, Pitch 1.27 mm, 8 Position, 0 to 70 degC, 8-Pin THD, RoHS, Bulk; Manufacturer: Pulse Electronics; Capacitance: -45f; Connector Type: SDCard; Gender: Female; Shielding: Shielded; Colour: Yellow; Manufacturer URL: http://www.pulseelectronics.com/; Pins: 8; Contact Plating: Gold; Min Operating Temperature: 0°C; Contact Material: Bronze; Datasheet URL: http://productfinder.pulseeng.com/products/datasheets/J403.pdf; Packaging: Bulk; Max Operating Temperature: 70°C; Package Description: 12-Pin Through Hole Device, Body 21.59 x 16.26 mm, Pitch 1.27 mm; Lead Pitch: 2.54mm; Datasheet Version: Aug-12; Package Reference: J00-0065NL; Case/Package: J00-0065NL; Package Quantity: 25; Mounting Technology: TH; Contact Finish: Gold; RoHS Compliant: True
footprint PULS-J00-006XNL-E_V (THD, 12-Leads, Body 21.59x16.26mm, Pitch 1.27mm)
pins: 1 TD+, 2 TCT, 3 TD-, 4 NC, 5 RD+, 6 RCT, 7 RD-, 8 GND, 9, 10, 11, 12, S1, S2

## CMP-002-00005-2
designator SD?, comment SD-RSMT-2-MQ-WF
3M(TM) Card Connector SD(TM), 9 Position, 0.5 A, 3.6 V, -25 to 85 degC, 9-Pin SMD, RoHS, Tape and Reel; Max Current Rating: 500mA; Connector Type: SDCard; Voltage Rating (AC): 6V; Datasheet URL: http://datasheet.octopart.com/SD-RSMT-2-MQ-WF-3M-datasheet-11778935.pdf; Datasheet Version: Nov-06; Package Quantity: 300; Manufacturer URL: http://www.3m.com/; Case/Package: SD-RSMT-2-MQ-WF-11; Package Description: 9-Pin Surface Mount Device, Body 30.5 x 28 mm; Package Reference: SD-RSMT-2-MQ-WF-11; Packaging: TapeandReel; Min Operating Temperature: -25°C; Contact Finish: Gold; Colour: Black; Lead Pitch: 2.5mm; Mounting Technology: SM; Max Operating Temperature: 85°C; RoHS Compliant: True; Manufacturer: 3M; Contact Material: Copper; Pins: 8; Current Rating: 500mA
footprint 3M-SD-RSMT-2-MQ-WF-11_V (SMD, 9-Leads, Body 30.5x28mm)
pins: 1 CD/DAT3, 2 CMD, 3 VSS1, 4 VDD, 5 CLK, 6 VSS2, 7 DAT0, 8 DAT1, 9 DAT2, 10 CD, 11 WP, 12 SHLD1, 13 SHLD2
text: CD/; DAT3; SD CARD; SHLD

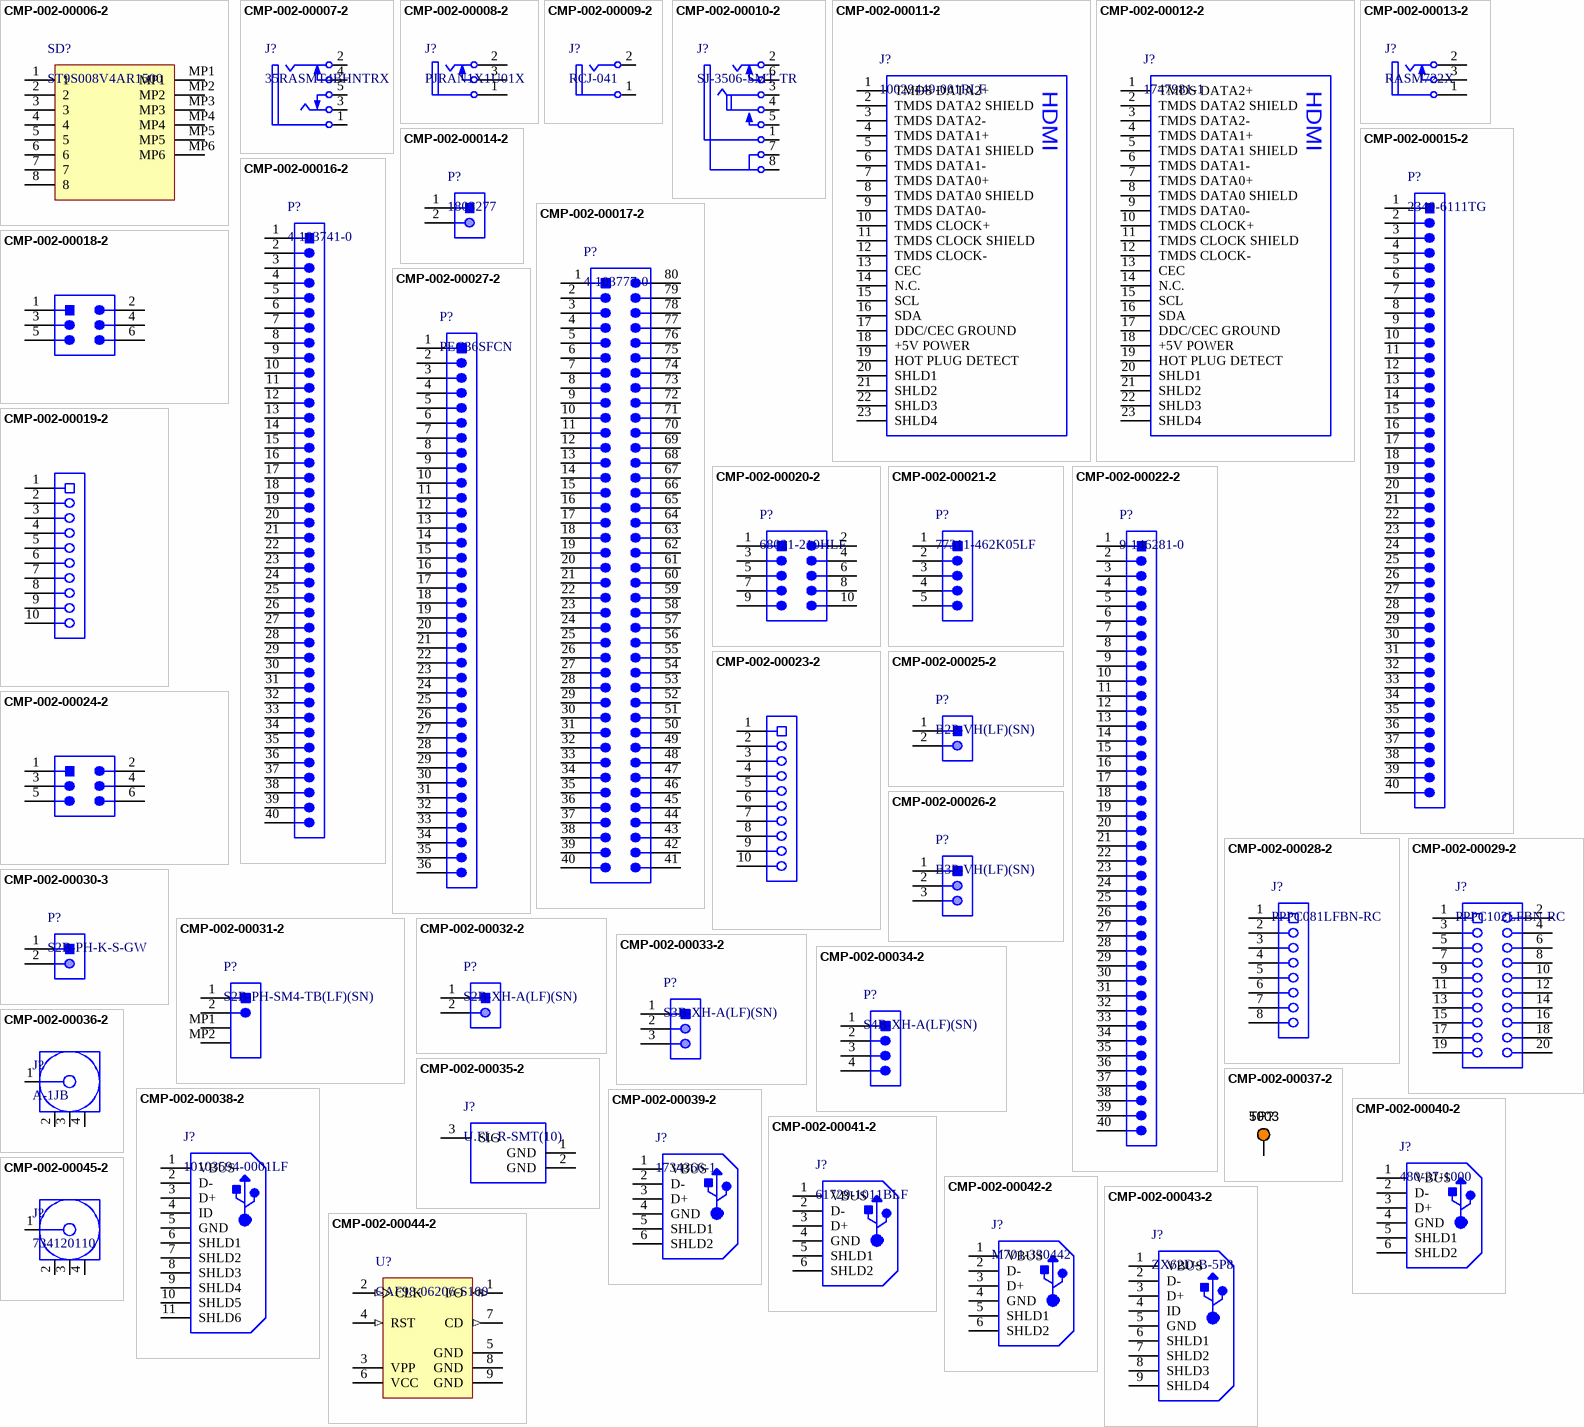
[diagram p3: symbols CMP-002-00006-2 to CMP-002-00045-2]
